# Altium schematic symbol library jlcpcb_2025_04_capacitors_extended_1206.schlib: 2503 symbols (part 9 of 14) (continued)
## CL31C471JBCNNNC
designator C?  Capacitance: 470pF  (hidden comment: *)
Capacitor, Ceramic (MLCC), 470pF, ±5%, 50V, C0G, ±5%, SMD 1206; Manufacturer: Samsung Electro-Mechanics; Manufacturer Part Number: CL31C471JBCNNNC; Package Size: 1206; JLCPCB Basic Part: No; JLCPCB Part Number: C730491; Supplier 1: LCSC; Category: Capacitors - MLCC; Supplier Part Number 1: C730491; Tolerance: ±5%; Voltage Rating: 50V; Temperature Coefficient: C0G; RoHS: Yes; ComponentLink1Description: Datasheet; ComponentLink2Description: JLCPCB Part URL; ComponentLink2URL: https://jlcpcb.com/partdetail/C730491; ComponentLink3Description: LCSC Part URL; ComponentLink3URL: https://lcsc.com/product-detail/Multilayer-Ceramic-Capacitors-MLCC---SMD-SMT_Samsung-Electro-Mechanics-Samsung-Electro-Mechanics-CL31C471JBCNNNC_C730491.html; ComponentLink4Description: Samsung Component Library; ComponentLink4URL: https://weblib.samsungsem.com/mlcc/mlcc-ec.do?partNumber=CL31C471JBCNNN
footprint CAP-1206 (1206 (3216M) Capacitor)
pins: 1, 2

## CL31C820JBCNNNC
designator C?  Capacitance: 82pF  (hidden comment: *)
Capacitor, Ceramic (MLCC), 82pF, ±5%, 50V, C0G, ±5%, SMD 1206; Manufacturer: Samsung Electro-Mechanics; Manufacturer Part Number: CL31C820JBCNNNC; Package Size: 1206; JLCPCB Basic Part: No; JLCPCB Part Number: C377819; Supplier 1: LCSC; Category: Capacitors - MLCC; Supplier Part Number 1: C377819; Tolerance: ±5%; Voltage Rating: 50V; Temperature Coefficient: C0G; RoHS: Yes; ComponentLink1Description: Datasheet; ComponentLink1URL: https://wmsc.lcsc.com/wmsc/upload/file/pdf/v2/lcsc/2304140030_Samsung-Electro-Mechanics-CL31C820JBCNNNC_C377819.pdf; ComponentLink2Description: JLCPCB Part URL; ComponentLink2URL: https://jlcpcb.com/partdetail/C377819; ComponentLink3Description: LCSC Part URL; ComponentLink3URL: https://lcsc.com/product-detail/Multilayer-Ceramic-Capacitors-MLCC---SMD-SMT_Samsung-Electro-Mechanics-Samsung-Electro-Mechanics-CL31C820JBCNNNC_C377819.html; ComponentLink4Description: Samsung Component Library; ComponentLink4URL: https://weblib.samsungsem.com/mlcc/mlcc-ec.do?partNumber=CL31C820JBCNNN
footprint CAP-1206 (1206 (3216M) Capacitor)
pins: 1, 2

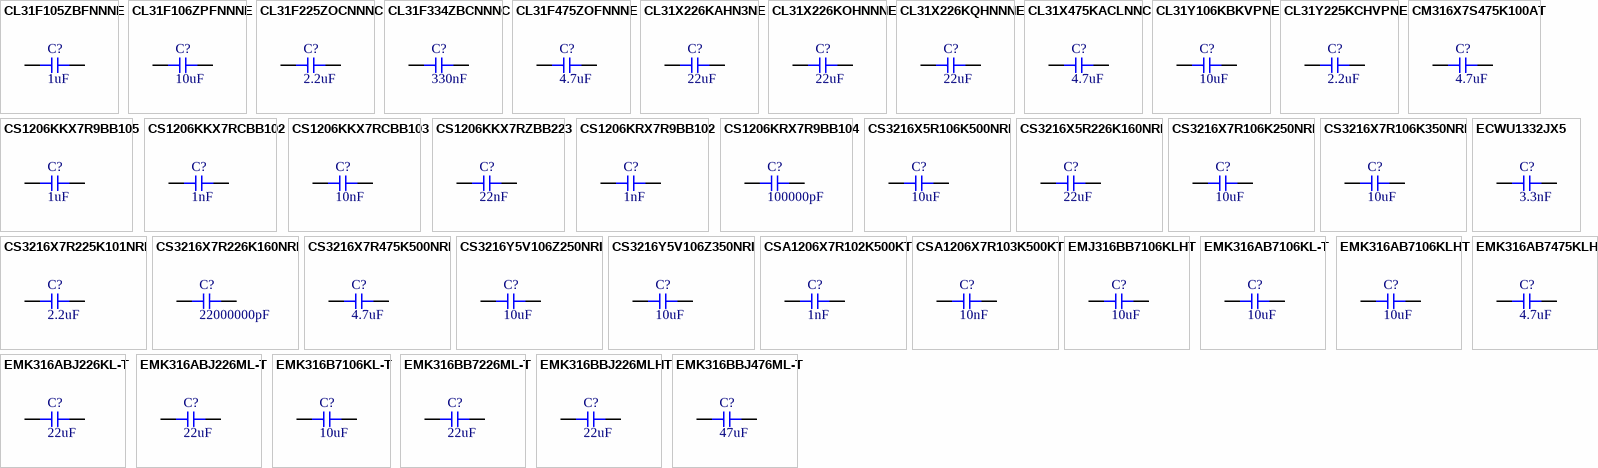
[diagram p39: symbols CL31F105ZBFNNNE to EMK316BBJ476ML-T]

## CL31F105ZBFNNNE
designator C?  Capacitance: 1uF  (hidden comment: *)
Capacitor, Ceramic (MLCC), 1uF, 50V, Y5V, SMD 1206; Manufacturer: Samsung Electro-Mechanics; Manufacturer Part Number: CL31F105ZBFNNNE; Temperature Rating: -20%~+80%; Package Size: 1206; JLCPCB Basic Part: No; JLCPCB Part Number: C307582; Supplier 1: LCSC; Category: Capacitors - MLCC; Supplier Part Number 1: C307582; Voltage Rating: 50V; Temperature Coefficient: Y5V; RoHS: Yes; ComponentLink1Description: Datasheet; ComponentLink1URL: https://wmsc.lcsc.com/wmsc/upload/file/pdf/v2/lcsc/2304140030_Samsung-Electro-Mechanics-CL31F105ZBFNNNE_C307582.pdf; ComponentLink2Description: JLCPCB Part URL; ComponentLink2URL: https://jlcpcb.com/partdetail/C307582; ComponentLink3Description: LCSC Part URL; ComponentLink3URL: https://lcsc.com/product-detail/Multilayer-Ceramic-Capacitors-MLCC---SMD-SMT_Samsung-Electro-Mechanics-Samsung-Electro-Mechanics-CL31F105ZBFNNNE_C307582.html; ComponentLink4Description: Samsung Component Library; ComponentLink4URL: https://weblib.samsungsem.com/mlcc/mlcc-ec.do?partNumber=CL31F105ZBFNNN
footprint CAP-1206 (1206 (3216M) Capacitor)
pins: 1, 2

## CL31F106ZPFNNNE
designator C?  Capacitance: 10uF  (hidden comment: *)
Capacitor, Ceramic (MLCC), 10uF, 10V, Y5V, SMD 1206; Manufacturer: Samsung Electro-Mechanics; Manufacturer Part Number: CL31F106ZPFNNNE; Temperature Rating: -20%~+80%; Package Size: 1206; JLCPCB Basic Part: No; JLCPCB Part Number: C170100; Supplier 1: LCSC; Category: Capacitors - MLCC; Supplier Part Number 1: C170100; Voltage Rating: 10V; Temperature Coefficient: Y5V; RoHS: Yes; ComponentLink1Description: Datasheet; ComponentLink1URL: https://wmsc.lcsc.com/wmsc/upload/file/pdf/v2/lcsc/2304140030_Samsung-Electro-Mechanics-CL31F106ZPFNNNE_C170100.pdf; ComponentLink2Description: JLCPCB Part URL; ComponentLink2URL: https://jlcpcb.com/partdetail/C170100; ComponentLink3Description: LCSC Part URL; ComponentLink3URL: https://lcsc.com/product-detail/Multilayer-Ceramic-Capacitors-MLCC---SMD-SMT_Samsung-Electro-Mechanics-Samsung-Electro-Mechanics-CL31F106ZPFNNNE_C170100.html; ComponentLink4Description: Samsung Component Library; ComponentLink4URL: https://weblib.samsungsem.com/mlcc/mlcc-ec.do?partNumber=CL31F106ZPFNNN
footprint CAP-1206 (1206 (3216M) Capacitor)
pins: 1, 2

## CL31F225ZOCNNNC
designator C?  Capacitance: 2.2uF  (hidden comment: *)
Capacitor, Ceramic (MLCC), 2.2uF, 16V, Y5V, SMD 1206; Manufacturer: Samsung Electro-Mechanics; Manufacturer Part Number: CL31F225ZOCNNNC; Temperature Rating: -20%~+80%; Package Size: 1206; JLCPCB Basic Part: No; JLCPCB Part Number: C307583; Supplier 1: LCSC; Category: Capacitors - MLCC; Supplier Part Number 1: C307583; Voltage Rating: 16V; Temperature Coefficient: Y5V; RoHS: Yes; ComponentLink1Description: Datasheet; ComponentLink1URL: https://wmsc.lcsc.com/wmsc/upload/file/pdf/v2/lcsc/2304140030_Samsung-Electro-Mechanics-CL31F225ZOCNNNC_C307583.pdf; ComponentLink2Description: JLCPCB Part URL; ComponentLink2URL: https://jlcpcb.com/partdetail/C307583; ComponentLink3Description: LCSC Part URL; ComponentLink3URL: https://lcsc.com/product-detail/Multilayer-Ceramic-Capacitors-MLCC---SMD-SMT_Samsung-Electro-Mechanics-Samsung-Electro-Mechanics-CL31F225ZOCNNNC_C307583.html; ComponentLink4Description: Samsung Component Library; ComponentLink4URL: https://weblib.samsungsem.com/mlcc/mlcc-ec.do?partNumber=CL31F225ZOCNNN
footprint CAP-1206 (1206 (3216M) Capacitor)
pins: 1, 2

## CL31F334ZBCNNNC
designator C?  Capacitance: 330nF  (hidden comment: *)
Capacitor, Ceramic (MLCC), 330nF, 50V, Y5V, SMD 1206; Manufacturer: Samsung Electro-Mechanics; Manufacturer Part Number: CL31F334ZBCNNNC; Temperature Rating: -20%~+80%; Package Size: 1206; JLCPCB Basic Part: No; JLCPCB Part Number: C377820; Supplier 1: LCSC; Category: Capacitors - MLCC; Supplier Part Number 1: C377820; Voltage Rating: 50V; Temperature Coefficient: Y5V; RoHS: Yes; ComponentLink1Description: Datasheet; ComponentLink1URL: https://wmsc.lcsc.com/wmsc/upload/file/pdf/v2/lcsc/2304140030_Samsung-Electro-Mechanics-CL31F334ZBCNNNC_C377820.pdf; ComponentLink2Description: JLCPCB Part URL; ComponentLink2URL: https://jlcpcb.com/partdetail/C377820; ComponentLink3Description: LCSC Part URL; ComponentLink3URL: https://lcsc.com/product-detail/Multilayer-Ceramic-Capacitors-MLCC---SMD-SMT_Samsung-Electro-Mechanics-Samsung-Electro-Mechanics-CL31F334ZBCNNNC_C377820.html; ComponentLink4Description: Samsung Component Library; ComponentLink4URL: https://weblib.samsungsem.com/mlcc/mlcc-ec.do?partNumber=CL31F334ZBCNNN
footprint CAP-1206 (1206 (3216M) Capacitor)
pins: 1, 2

## CL31F475ZOFNNNE
designator C?  Capacitance: 4.7uF  (hidden comment: *)
Capacitor, Ceramic (MLCC), 4.7uF, 16V, Y5V, SMD 1206; Manufacturer: Samsung Electro-Mechanics; Manufacturer Part Number: CL31F475ZOFNNNE; Temperature Rating: -20%~+80%; Package Size: 1206; JLCPCB Basic Part: No; JLCPCB Part Number: C159748; Supplier 1: LCSC; Category: Capacitors - MLCC; Supplier Part Number 1: C159748; Voltage Rating: 16V; Temperature Coefficient: Y5V; RoHS: Yes; ComponentLink1Description: Datasheet; ComponentLink1URL: https://wmsc.lcsc.com/wmsc/upload/file/pdf/v2/lcsc/2304140030_Samsung-Electro-Mechanics-CL31F475ZOFNNNE_C159748.pdf; ComponentLink2Description: JLCPCB Part URL; ComponentLink2URL: https://jlcpcb.com/partdetail/C159748; ComponentLink3Description: LCSC Part URL; ComponentLink3URL: https://lcsc.com/product-detail/Multilayer-Ceramic-Capacitors-MLCC---SMD-SMT_Samsung-Electro-Mechanics-Samsung-Electro-Mechanics-CL31F475ZOFNNNE_C159748.html; ComponentLink4Description: Samsung Component Library; ComponentLink4URL: https://weblib.samsungsem.com/mlcc/mlcc-ec.do?partNumber=CL31F475ZOFNNN
footprint CAP-1206 (1206 (3216M) Capacitor)
pins: 1, 2

## CL31X226KAHN3NE
designator C?  Capacitance: 22uF  (hidden comment: *)
Capacitor, Ceramic (MLCC), 22uF, ±10%, 25V, X6S, ±10%, SMD 1206; Manufacturer: Samsung Electro-Mechanics; Manufacturer Part Number: CL31X226KAHN3NE; Package Size: 1206; JLCPCB Basic Part: No; JLCPCB Part Number: C478862; Supplier 1: LCSC; Category: Capacitors - MLCC; Supplier Part Number 1: C478862; Tolerance: ±10%; Voltage Rating: 25V; Temperature Coefficient: X6S; RoHS: Yes; ComponentLink1Description: Datasheet; ComponentLink1URL: https://wmsc.lcsc.com/wmsc/upload/file/pdf/v2/lcsc/2304140030_Samsung-Electro-Mechanics-CL31X226KAHN3NE_C478862.pdf; ComponentLink2Description: JLCPCB Part URL; ComponentLink2URL: https://jlcpcb.com/partdetail/C478862; ComponentLink3Description: LCSC Part URL; ComponentLink3URL: https://lcsc.com/product-detail/Multilayer-Ceramic-Capacitors-MLCC---SMD-SMT_Samsung-Electro-Mechanics-Samsung-Electro-Mechanics-CL31X226KAHN3NE_C478862.html; ComponentLink4Description: Samsung Component Library; ComponentLink4URL: https://weblib.samsungsem.com/mlcc/mlcc-ec.do?partNumber=CL31X226KAHN3N
footprint CAP-1206 (1206 (3216M) Capacitor)
pins: 1, 2

## CL31X226KOHNNNE
designator C?  Capacitance: 22uF  (hidden comment: *)
Capacitor, Ceramic (MLCC), 22uF, ±10%, 16V, X6S, ±10%, SMD 1206; Manufacturer: Samsung Electro-Mechanics; Manufacturer Part Number: CL31X226KOHNNNE; Package Size: 1206; JLCPCB Basic Part: No; JLCPCB Part Number: C2991797; Supplier 1: LCSC; Category: Capacitors - MLCC; Supplier Part Number 1: C2991797; Tolerance: ±10%; Voltage Rating: 16V; Temperature Coefficient: X6S; RoHS: Yes; ComponentLink1Description: Datasheet; ComponentLink1URL: https://wmsc.lcsc.com/wmsc/upload/file/pdf/v2/lcsc/2204111630_Samsung-Electro-Mechanics-CL31X226KOHNNNE_C2991797.pdf; ComponentLink2Description: JLCPCB Part URL; ComponentLink2URL: https://jlcpcb.com/partdetail/C2991797; ComponentLink3Description: LCSC Part URL; ComponentLink3URL: https://lcsc.com/product-detail/Multilayer-Ceramic-Capacitors-MLCC---SMD-SMT_Samsung-Electro-Mechanics-Samsung-Electro-Mechanics-CL31X226KOHNNNE_C2991797.html; ComponentLink4Description: Samsung Component Library; ComponentLink4URL: https://weblib.samsungsem.com/mlcc/mlcc-ec.do?partNumber=CL31X226KOHNNN
footprint CAP-1206 (1206 (3216M) Capacitor)
pins: 1, 2

## CL31X226KQHNNNE
designator C?  Capacitance: 22uF  (hidden comment: *)
Capacitor, Ceramic (MLCC), 22uF, ±10%, 6.3V, X6S, ±10%, SMD 1206; Manufacturer: Samsung Electro-Mechanics; Manufacturer Part Number: CL31X226KQHNNNE; Package Size: 1206; JLCPCB Basic Part: No; JLCPCB Part Number: C444887; Supplier 1: LCSC; Category: Capacitors - MLCC; Supplier Part Number 1: C444887; Tolerance: ±10%; Voltage Rating: 6.3V; Temperature Coefficient: X6S; RoHS: Yes; ComponentLink1Description: Datasheet; ComponentLink1URL: https://wmsc.lcsc.com/wmsc/upload/file/pdf/v2/lcsc/2004091405_Samsung-Electro-Mechanics-CL31X226KQHNNNE_C444887.pdf; ComponentLink2Description: JLCPCB Part URL; ComponentLink2URL: https://jlcpcb.com/partdetail/C444887; ComponentLink3Description: LCSC Part URL; ComponentLink3URL: https://lcsc.com/product-detail/Multilayer-Ceramic-Capacitors-MLCC---SMD-SMT_Samsung-Electro-Mechanics-Samsung-Electro-Mechanics-CL31X226KQHNNNE_C444887.html; ComponentLink4Description: Samsung Component Library; ComponentLink4URL: https://weblib.samsungsem.com/mlcc/mlcc-ec.do?partNumber=CL31X226KQHNNN
footprint CAP-1206 (1206 (3216M) Capacitor)
pins: 1, 2

## CL31X475KACLNNC
designator C?  Capacitance: 4.7uF  (hidden comment: *)
Capacitor, Ceramic (MLCC), 4.7uF, ±10%, 25V, X6S, ±10%, SMD 1206; Manufacturer: Samsung Electro-Mechanics; Manufacturer Part Number: CL31X475KACLNNC; Package Size: 1206; JLCPCB Basic Part: No; JLCPCB Part Number: C377822; Supplier 1: LCSC; Category: Capacitors - MLCC; Supplier Part Number 1: C377822; Tolerance: ±10%; Voltage Rating: 25V; Temperature Coefficient: X6S; RoHS: Yes; ComponentLink1Description: Datasheet; ComponentLink1URL: https://wmsc.lcsc.com/wmsc/upload/file/pdf/v2/lcsc/2304140030_Samsung-Electro-Mechanics-CL31X475KACLNNC_C377822.pdf; ComponentLink2Description: JLCPCB Part URL; ComponentLink2URL: https://jlcpcb.com/partdetail/C377822; ComponentLink3Description: LCSC Part URL; ComponentLink3URL: https://lcsc.com/product-detail/Multilayer-Ceramic-Capacitors-MLCC---SMD-SMT_Samsung-Electro-Mechanics-Samsung-Electro-Mechanics-CL31X475KACLNNC_C377822.html; ComponentLink4Description: Samsung Component Library; ComponentLink4URL: https://weblib.samsungsem.com/mlcc/mlcc-ec.do?partNumber=CL31X475KACLNN
footprint CAP-1206 (1206 (3216M) Capacitor)
pins: 1, 2

## CL31Y106KBKVPNE
designator C?  Capacitance: 10uF  (hidden comment: *)
Capacitor, Ceramic (MLCC), 10uF, ±10%, 50V, ±10%, SMD 1206; Manufacturer: Samsung Electro-Mechanics; Manufacturer Part Number: CL31Y106KBKVPNE; Package Size: 1206; JLCPCB Basic Part: No; JLCPCB Part Number: C2803389; Supplier 1: LCSC; Category: Capacitors - MLCC; Supplier Part Number 1: C2803389; Tolerance: ±10%; Voltage Rating: 50V; RoHS: Yes; ComponentLink1Description: Datasheet; ComponentLink1URL: https://wmsc.lcsc.com/wmsc/upload/file/pdf/v2/lcsc/2304140030_Samsung-Electro-Mechanics-CL31Y106KBKVPNE_C2803389.pdf; ComponentLink2Description: JLCPCB Part URL; ComponentLink2URL: https://jlcpcb.com/partdetail/C2803389; ComponentLink3Description: LCSC Part URL; ComponentLink3URL: https://lcsc.com/product-detail/Multilayer-Ceramic-Capacitors-MLCC---SMD-SMT_Samsung-Electro-Mechanics-Samsung-Electro-Mechanics-CL31Y106KBKVPNE_C2803389.html; ComponentLink4Description: Samsung Component Library; ComponentLink4URL: https://weblib.samsungsem.com/mlcc/mlcc-ec.do?partNumber=CL31Y106KBKVPN
footprint CAP-1206 (1206 (3216M) Capacitor)
pins: 1, 2

## CL31Y225KCHVPNE
designator C?  Capacitance: 2.2uF  (hidden comment: *)
Capacitor, Ceramic (MLCC), 2.2uF, ±10%, 100V, X7S, ±10%, SMD 1206; Manufacturer: Samsung Electro-Mechanics; Manufacturer Part Number: CL31Y225KCHVPNE; Package Size: 1206; JLCPCB Basic Part: No; JLCPCB Part Number: C2803390; Supplier 1: LCSC; Category: Capacitors - MLCC; Supplier Part Number 1: C2803390; Tolerance: ±10%; Voltage Rating: 100V; Temperature Coefficient: X7S; RoHS: Yes; ComponentLink1Description: Datasheet; ComponentLink1URL: https://wmsc.lcsc.com/wmsc/upload/file/pdf/v2/lcsc/2304140030_Samsung-Electro-Mechanics-CL31Y225KCHVPNE_C2803390.pdf; ComponentLink2Description: JLCPCB Part URL; ComponentLink2URL: https://jlcpcb.com/partdetail/C2803390; ComponentLink3Description: LCSC Part URL; ComponentLink3URL: https://lcsc.com/product-detail/Multilayer-Ceramic-Capacitors-MLCC---SMD-SMT_Samsung-Electro-Mechanics-Samsung-Electro-Mechanics-CL31Y225KCHVPNE_C2803390.html; ComponentLink4Description: Samsung Component Library; ComponentLink4URL: https://weblib.samsungsem.com/mlcc/mlcc-ec.do?partNumber=CL31Y225KCHVPN
footprint CAP-1206 (1206 (3216M) Capacitor)
pins: 1, 2

## CM316X7S475K100AT
designator C?  Capacitance: 4.7uF  (hidden comment: *)
Capacitor, Ceramic (MLCC), 4.7uF, ±10%, 100V, X7S, ±10%, SMD 1206; Manufacturer: Kyocera; Manufacturer Part Number: CM316X7S475K100AT; Package Size: 1206; JLCPCB Basic Part: No; JLCPCB Part Number: C2900750; Supplier 1: LCSC; Category: Capacitors - MLCC; Supplier Part Number 1: C2900750; Tolerance: ±10%; Voltage Rating: 100V; Temperature Coefficient: X7S; RoHS: Yes; ComponentLink1Description: Datasheet; ComponentLink1URL: https://wmsc.lcsc.com/wmsc/upload/file/pdf/v2/lcsc/2110121030_Kyocera-AVX-CM316X7S475K100AT_C2900750.pdf; ComponentLink2Description: JLCPCB Part URL; ComponentLink2URL: https://jlcpcb.com/partdetail/C2900750; ComponentLink3Description: LCSC Part URL; ComponentLink3URL: https://lcsc.com/product-detail/Multilayer-Ceramic-Capacitors-MLCC---SMD-SMT_Kyocera-AVX-Kyocera-AVX-CM316X7S475K100AT_C2900750.html
footprint CAP-1206 (1206 (3216M) Capacitor)
pins: 1, 2

## CS1206KKX7R9BB105
designator C?  Capacitance: 1uF  (hidden comment: *)
Capacitor, Ceramic (MLCC), 1uF, ±10%, 50V, X7R, ±10%, SMD 1206; Manufacturer: YAGEO; Manufacturer Part Number: CS1206KKX7R9BB105; Package Size: 1206; JLCPCB Basic Part: No; JLCPCB Part Number: C577433; Supplier 1: LCSC; Category: Capacitors - MLCC; Supplier Part Number 1: C577433; Tolerance: ±10%; Voltage Rating: 50V; Temperature Coefficient: X7R; RoHS: Yes; ComponentLink1Description: Datasheet; ComponentLink1URL: https://wmsc.lcsc.com/wmsc/upload/file/pdf/v2/lcsc/2304140030_YAGEO-CS1206KKX7R9BB105_C577433.pdf; ComponentLink2Description: JLCPCB Part URL; ComponentLink2URL: https://jlcpcb.com/partdetail/C577433; ComponentLink3Description: LCSC Part URL; ComponentLink3URL: https://lcsc.com/product-detail/Multilayer-Ceramic-Capacitors-MLCC---SMD-SMT_YAGEO-YAGEO-CS1206KKX7R9BB105_C577433.html
footprint CAP-1206 (1206 (3216M) Capacitor)
pins: 1, 2

## CS1206KKX7RCBB102
designator C?  Capacitance: 1nF  (hidden comment: *)
Capacitor, Ceramic (MLCC), 1nF, ±10%, X7R, ±10%, SMD 1206; Manufacturer: YAGEO; Manufacturer Part Number: CS1206KKX7RCBB102; Package Size: 1206; JLCPCB Basic Part: No; JLCPCB Part Number: C577435; Supplier 1: LCSC; Category: Capacitors - MLCC; Supplier Part Number 1: C577435; Tolerance: ±10%; Temperature Coefficient: X7R; RoHS: Yes; ComponentLink1Description: Datasheet; ComponentLink1URL: https://wmsc.lcsc.com/wmsc/upload/file/pdf/v2/lcsc/2208251800_YAGEO-CS1206KKX7RCBB102_C577435.pdf; ComponentLink2Description: JLCPCB Part URL; ComponentLink2URL: https://jlcpcb.com/partdetail/C577435; ComponentLink3Description: LCSC Part URL; ComponentLink3URL: https://lcsc.com/product-detail/Multilayer-Ceramic-Capacitors-MLCC---SMD-SMT_YAGEO-YAGEO-CS1206KKX7RCBB102_C577435.html
footprint CAP-1206 (1206 (3216M) Capacitor)
pins: 1, 2

## CS1206KKX7RCBB103
designator C?  Capacitance: 10nF  (hidden comment: *)
Capacitor, Ceramic (MLCC), 10nF, ±10%, 1kV, X7R, ±10%, SMD 1206; Manufacturer: YAGEO; Manufacturer Part Number: CS1206KKX7RCBB103; Package Size: 1206; JLCPCB Basic Part: No; JLCPCB Part Number: C577436; Supplier 1: LCSC; Category: Capacitors - MLCC; Supplier Part Number 1: C577436; Tolerance: ±10%; Voltage Rating: 1kV; Temperature Coefficient: X7R; RoHS: Yes; ComponentLink1Description: Datasheet; ComponentLink1URL: https://wmsc.lcsc.com/wmsc/upload/file/pdf/v2/lcsc/2304140030_YAGEO-CS1206KKX7RCBB103_C577436.pdf; ComponentLink2Description: JLCPCB Part URL; ComponentLink2URL: https://jlcpcb.com/partdetail/C577436; ComponentLink3Description: LCSC Part URL; ComponentLink3URL: https://lcsc.com/product-detail/Multilayer-Ceramic-Capacitors-MLCC---SMD-SMT_YAGEO-YAGEO-CS1206KKX7RCBB103_C577436.html
footprint CAP-1206 (1206 (3216M) Capacitor)
pins: 1, 2

## CS1206KKX7RZBB223
designator C?  Capacitance: 22nF  (hidden comment: *)
Capacitor, Ceramic (MLCC), 22nF, ±10%, 630V, X7R, ±10%, SMD 1206; Manufacturer: YAGEO; Manufacturer Part Number: CS1206KKX7RZBB223; Package Size: 1206; JLCPCB Basic Part: No; JLCPCB Part Number: C577440; Supplier 1: LCSC; Category: Capacitors - MLCC; Supplier Part Number 1: C577440; Tolerance: ±10%; Voltage Rating: 630V; Temperature Coefficient: X7R; RoHS: Yes; ComponentLink1Description: Datasheet; ComponentLink1URL: https://wmsc.lcsc.com/wmsc/upload/file/pdf/v2/lcsc/2112151030_YAGEO-CS1206KKX7RZBB223_C577440.pdf; ComponentLink2Description: JLCPCB Part URL; ComponentLink2URL: https://jlcpcb.com/partdetail/C577440; ComponentLink3Description: LCSC Part URL; ComponentLink3URL: https://lcsc.com/product-detail/Multilayer-Ceramic-Capacitors-MLCC---SMD-SMT_YAGEO-YAGEO-CS1206KKX7RZBB223_C577440.html
footprint CAP-1206 (1206 (3216M) Capacitor)
pins: 1, 2

## CS1206KRX7R9BB102
designator C?  Capacitance: 1nF  (hidden comment: *)
Capacitor, Ceramic (MLCC), 1nF, ±10%, 50V, X7R, ±10%, SMD 1206; Manufacturer: YAGEO; Manufacturer Part Number: CS1206KRX7R9BB102; Package Size: 1206; JLCPCB Basic Part: No; JLCPCB Part Number: C2173292; Supplier 1: LCSC; Category: Capacitors - MLCC; Supplier Part Number 1: C2173292; Tolerance: ±10%; Voltage Rating: 50V; Temperature Coefficient: X7R; RoHS: Yes; ComponentLink1Description: Datasheet; ComponentLink1URL: https://wmsc.lcsc.com/wmsc/upload/file/pdf/v2/lcsc/2202040630_YAGEO-CS1206KRX7R9BB102_C2173292.pdf; ComponentLink2Description: JLCPCB Part URL; ComponentLink2URL: https://jlcpcb.com/partdetail/C2173292; ComponentLink3Description: LCSC Part URL; ComponentLink3URL: https://lcsc.com/product-detail/Multilayer-Ceramic-Capacitors-MLCC---SMD-SMT_YAGEO-YAGEO-CS1206KRX7R9BB102_C2173292.html
footprint CAP-1206 (1206 (3216M) Capacitor)
pins: 1, 2

## CS1206KRX7R9BB104
designator C?  Capacitance: 100000pF  (hidden comment: *)
Capacitor, Ceramic (MLCC), 100000pF, ±10%, null, X7R, ±10%, SMD 1206; Manufacturer: YAGEO; Manufacturer Part Number: CS1206KRX7R9BB104; Package Size: 1206; JLCPCB Basic Part: No; JLCPCB Part Number: C577441; Supplier 1: LCSC; Category: Capacitors - MLCC; Supplier Part Number 1: C577441; Tolerance: ±10%; Voltage Rating: null; Temperature Coefficient: X7R; RoHS: Yes; ComponentLink1Description: Datasheet; ComponentLink1URL: https://wmsc.lcsc.com/wmsc/upload/file/pdf/v2/lcsc/2211211800_YAGEO-CS1206KRX7R9BB104_C577441.pdf; ComponentLink2Description: JLCPCB Part URL; ComponentLink2URL: https://jlcpcb.com/partdetail/C577441; ComponentLink3Description: LCSC Part URL; ComponentLink3URL: https://lcsc.com/product-detail/Multilayer-Ceramic-Capacitors-MLCC---SMD-SMT_YAGEO-YAGEO-CS1206KRX7R9BB104_C577441.html
footprint CAP-1206 (1206 (3216M) Capacitor)
pins: 1, 2

## CS3216X5R106K500NRI
designator C?  Capacitance: 10uF  (hidden comment: *)
Capacitor, Ceramic (MLCC), 10uF, ±10%, 50V, X5R, ±10%, SMD 1206; Manufacturer: Samwha Capacitor; Manufacturer Part Number: CS3216X5R106K500NRI; Package Size: 1206; JLCPCB Basic Part: No; JLCPCB Part Number: C513774; Supplier 1: LCSC; Category: Capacitors - MLCC; Supplier Part Number 1: C513774; Tolerance: ±10%; Voltage Rating: 50V; Temperature Coefficient: X5R; RoHS: Yes; ComponentLink1Description: Datasheet; ComponentLink1URL: https://wmsc.lcsc.com/wmsc/upload/file/pdf/v2/lcsc/2005191033_Samwha-Capacitor-CS3216X5R106K500NRI_C513774.pdf; ComponentLink2Description: JLCPCB Part URL; ComponentLink2URL: https://jlcpcb.com/partdetail/C513774; ComponentLink3Description: LCSC Part URL; ComponentLink3URL: https://lcsc.com/product-detail/Multilayer-Ceramic-Capacitors-MLCC---SMD-SMT_Samwha-Capacitor-Samwha-Capacitor-CS3216X5R106K500NRI_C513774.html
footprint CAP-1206 (1206 (3216M) Capacitor)
pins: 1, 2

## CS3216X5R226K160NRI
designator C?  Capacitance: 22uF  (hidden comment: *)
Capacitor, Ceramic (MLCC), 22uF, ±10%, 16V, X5R, ±10%, SMD 1206; Manufacturer: Samwha Capacitor; Manufacturer Part Number: CS3216X5R226K160NRI; Package Size: 1206; JLCPCB Basic Part: No; JLCPCB Part Number: C513771; Supplier 1: LCSC; Category: Capacitors - MLCC; Supplier Part Number 1: C513771; Tolerance: ±10%; Voltage Rating: 16V; Temperature Coefficient: X5R; RoHS: Yes; ComponentLink1Description: Datasheet; ComponentLink1URL: https://wmsc.lcsc.com/wmsc/upload/file/pdf/v2/lcsc/2005291832_Samwha-Capacitor-CS3216X5R226K160NRI_C513771.pdf; ComponentLink2Description: JLCPCB Part URL; ComponentLink2URL: https://jlcpcb.com/partdetail/C513771; ComponentLink3Description: LCSC Part URL; ComponentLink3URL: https://lcsc.com/product-detail/Multilayer-Ceramic-Capacitors-MLCC---SMD-SMT_Samwha-Capacitor-Samwha-Capacitor-CS3216X5R226K160NRI_C513771.html
footprint CAP-1206 (1206 (3216M) Capacitor)
pins: 1, 2

## CS3216X7R106K250NRI
designator C?  Capacitance: 10uF  (hidden comment: *)
Capacitor, Ceramic (MLCC), 10uF, ±10%, 25V, X7R, ±10%, SMD 1206; Manufacturer: Samwha Capacitor; Manufacturer Part Number: CS3216X7R106K250NRI; Package Size: 1206; JLCPCB Basic Part: No; JLCPCB Part Number: C513767; Supplier 1: LCSC; Category: Capacitors - MLCC; Supplier Part Number 1: C513767; Tolerance: ±10%; Voltage Rating: 25V; Temperature Coefficient: X7R; RoHS: Yes; ComponentLink1Description: Datasheet; ComponentLink1URL: https://wmsc.lcsc.com/wmsc/upload/file/pdf/v2/lcsc/2007271833_Samwha-Capacitor-CS3216X7R106K250NRI_C513767.pdf; ComponentLink2Description: JLCPCB Part URL; ComponentLink2URL: https://jlcpcb.com/partdetail/C513767; ComponentLink3Description: LCSC Part URL; ComponentLink3URL: https://lcsc.com/product-detail/Multilayer-Ceramic-Capacitors-MLCC---SMD-SMT_Samwha-Capacitor-Samwha-Capacitor-CS3216X7R106K250NRI_C513767.html
footprint CAP-1206 (1206 (3216M) Capacitor)
pins: 1, 2

## CS3216X7R106K350NRI
designator C?  Capacitance: 10uF  (hidden comment: *)
Capacitor, Ceramic (MLCC), 10uF, ±10%, 35V, ±10%, SMD 1206; Manufacturer: Samwha Capacitor; Manufacturer Part Number: CS3216X7R106K350NRI; Package Size: 1206; JLCPCB Basic Part: No; JLCPCB Part Number: C920965; Supplier 1: LCSC; Category: Capacitors - MLCC; Supplier Part Number 1: C920965; Tolerance: ±10%; Voltage Rating: 35V; RoHS: Yes; ComponentLink1Description: Datasheet; ComponentLink2Description: JLCPCB Part URL; ComponentLink2URL: https://jlcpcb.com/partdetail/C920965; ComponentLink3Description: LCSC Part URL; ComponentLink3URL: https://lcsc.com/product-detail/Multilayer-Ceramic-Capacitors-MLCC---SMD-SMT_Samwha-Capacitor-Samwha-Capacitor-CS3216X7R106K350NRI_C920965.html
footprint CAP-1206 (1206 (3216M) Capacitor)
pins: 1, 2

## CS3216X7R225K101NRI
designator C?  Capacitance: 2.2uF  (hidden comment: *)
Capacitor, Ceramic (MLCC), 2.2uF, ±10%, 100V, ±10%, SMD 1206; Manufacturer: Samwha Capacitor; Manufacturer Part Number: CS3216X7R225K101NRI; Package Size: 1206; JLCPCB Basic Part: No; JLCPCB Part Number: C920964; Supplier 1: LCSC; Category: Capacitors - MLCC; Supplier Part Number 1: C920964; Tolerance: ±10%; Voltage Rating: 100V; RoHS: Yes; ComponentLink1Description: Datasheet; ComponentLink1URL: https://wmsc.lcsc.com/wmsc/upload/file/pdf/v2/lcsc/2203281730_Samwha-Capacitor-CS3216X7R225K101NRI_C920964.pdf; ComponentLink2Description: JLCPCB Part URL; ComponentLink2URL: https://jlcpcb.com/partdetail/C920964; ComponentLink3Description: LCSC Part URL; ComponentLink3URL: https://lcsc.com/product-detail/Multilayer-Ceramic-Capacitors-MLCC---SMD-SMT_Samwha-Capacitor-Samwha-Capacitor-CS3216X7R225K101NRI_C920964.html
footprint CAP-1206 (1206 (3216M) Capacitor)
pins: 1, 2

## CS3216X7R226K160NRI
designator C?  Capacitance: 22000000pF  (hidden comment: *)
Capacitor, Ceramic (MLCC), 22000000pF, ±10%, 16V, X7R, ±10%, SMD 1206; Manufacturer: Samwha Capacitor; Manufacturer Part Number: CS3216X7R226K160NRI; Package Size: 1206; JLCPCB Basic Part: No; JLCPCB Part Number: C5252682; Supplier 1: LCSC; Category: Capacitors - MLCC; Supplier Part Number 1: C5252682; Tolerance: ±10%; Voltage Rating: 16V; Temperature Coefficient: X7R; RoHS: Yes; ComponentLink1Description: Datasheet; ComponentLink1URL: https://wmsc.lcsc.com/wmsc/upload/file/pdf/v2/lcsc/2211101800_Samwha-Capacitor-CS3216X7R226K160NRI_C5252682.pdf; ComponentLink2Description: JLCPCB Part URL; ComponentLink2URL: https://jlcpcb.com/partdetail/C5252682; ComponentLink3Description: LCSC Part URL; ComponentLink3URL: https://lcsc.com/product-detail/Multilayer-Ceramic-Capacitors-MLCC---SMD-SMT_Samwha-Capacitor-Samwha-Capacitor-CS3216X7R226K160NRI_C5252682.html
footprint CAP-1206 (1206 (3216M) Capacitor)
pins: 1, 2

## CS3216X7R475K500NRI
designator C?  Capacitance: 4.7uF  (hidden comment: *)
Capacitor, Ceramic (MLCC), 4.7uF, ±10%, 50V, X7R, ±10%, SMD 1206; Manufacturer: Samwha Capacitor; Manufacturer Part Number: CS3216X7R475K500NRI; Package Size: 1206; JLCPCB Basic Part: No; JLCPCB Part Number: C513768; Supplier 1: LCSC; Category: Capacitors - MLCC; Supplier Part Number 1: C513768; Tolerance: ±10%; Voltage Rating: 50V; Temperature Coefficient: X7R; RoHS: Yes; ComponentLink1Description: Datasheet; ComponentLink1URL: https://wmsc.lcsc.com/wmsc/upload/file/pdf/v2/lcsc/2304140030_Samwha-Capacitor-CS3216X7R475K500NRI_C513768.pdf; ComponentLink2Description: JLCPCB Part URL; ComponentLink2URL: https://jlcpcb.com/partdetail/C513768; ComponentLink3Description: LCSC Part URL; ComponentLink3URL: https://lcsc.com/product-detail/Multilayer-Ceramic-Capacitors-MLCC---SMD-SMT_Samwha-Capacitor-Samwha-Capacitor-CS3216X7R475K500NRI_C513768.html
footprint CAP-1206 (1206 (3216M) Capacitor)
pins: 1, 2

## CS3216Y5V106Z250NRI
designator C?  Capacitance: 10uF  (hidden comment: *)
Capacitor, Ceramic (MLCC), 10uF, 25V, Y5V, SMD 1206; Manufacturer: Samwha Capacitor; Manufacturer Part Number: CS3216Y5V106Z250NRI; Package Size: 1206; JLCPCB Basic Part: No; JLCPCB Part Number: C2985037; Supplier 1: LCSC; Category: Capacitors - MLCC; Supplier Part Number 1: C2985037; Voltage Rating: 25V; Temperature Coefficient: Y5V; RoHS: Yes; ComponentLink1Description: Datasheet; ComponentLink1URL: https://wmsc.lcsc.com/wmsc/upload/file/pdf/v2/lcsc/2206061700_Samwha-Capacitor-CS3216Y5V106Z250NRI_C2985037.pdf; ComponentLink2Description: JLCPCB Part URL; ComponentLink2URL: https://jlcpcb.com/partdetail/C2985037; ComponentLink3Description: LCSC Part URL; ComponentLink3URL: https://lcsc.com/product-detail/Multilayer-Ceramic-Capacitors-MLCC---SMD-SMT_Samwha-Capacitor-Samwha-Capacitor-CS3216Y5V106Z250NRI_C2985037.html
footprint CAP-1206 (1206 (3216M) Capacitor)
pins: 1, 2

## CS3216Y5V106Z350NRI
designator C?  Capacitance: 10uF  (hidden comment: *)
Capacitor, Ceramic (MLCC), 10uF, 35V, Y5V, SMD 1206; Manufacturer: Samwha Capacitor; Manufacturer Part Number: CS3216Y5V106Z350NRI; Temperature Rating: -20%~+80%; Package Size: 1206; JLCPCB Basic Part: No; JLCPCB Part Number: C2918487; Supplier 1: LCSC; Category: Capacitors - MLCC; Supplier Part Number 1: C2918487; Voltage Rating: 35V; Temperature Coefficient: Y5V; RoHS: Yes; ComponentLink1Description: Datasheet; ComponentLink1URL: https://wmsc.lcsc.com/wmsc/upload/file/pdf/v2/lcsc/2111172030_Samwha-Capacitor-CS3216Y5V106Z350NRI_C2918487.pdf; ComponentLink2Description: JLCPCB Part URL; ComponentLink2URL: https://jlcpcb.com/partdetail/C2918487; ComponentLink3Description: LCSC Part URL; ComponentLink3URL: https://lcsc.com/product-detail/Multilayer-Ceramic-Capacitors-MLCC---SMD-SMT_Samwha-Capacitor-Samwha-Capacitor-CS3216Y5V106Z350NRI_C2918487.html
footprint CAP-1206 (1206 (3216M) Capacitor)
pins: 1, 2

## CSA1206X7R102K500KT
designator C?  Capacitance: 1nF  (hidden comment: *)
Capacitor, Ceramic (MLCC), 1nF, ±10%, 50V, X7R, ±10%, SMD 1206; Manufacturer: HRE; Manufacturer Part Number: CSA1206X7R102K500KT; Package Size: 1206; JLCPCB Basic Part: No; JLCPCB Part Number: C3015149; Supplier 1: LCSC; Category: Capacitors - MLCC; Supplier Part Number 1: C3015149; Tolerance: ±10%; Voltage Rating: 50V; Temperature Coefficient: X7R; RoHS: Yes; ComponentLink1Description: Datasheet; ComponentLink1URL: https://wmsc.lcsc.com/wmsc/upload/file/pdf/v2/lcsc/2208051100_HRE-CSA1206X7R102K500KT_C3015149.pdf; ComponentLink2Description: JLCPCB Part URL; ComponentLink2URL: https://jlcpcb.com/partdetail/C3015149; ComponentLink3Description: LCSC Part URL; ComponentLink3URL: https://lcsc.com/product-detail/Multilayer-Ceramic-Capacitors-MLCC---SMD-SMT_HRE-HRE-CSA1206X7R102K500KT_C3015149.html
footprint CAP-1206 (1206 (3216M) Capacitor)
pins: 1, 2

## CSA1206X7R103K500KT
designator C?  Capacitance: 10nF  (hidden comment: *)
Capacitor, Ceramic (MLCC), 10nF, ±10%, 50V, X7R, ±10%, SMD 1206; Manufacturer: HRE; Manufacturer Part Number: CSA1206X7R103K500KT; Package Size: 1206; JLCPCB Basic Part: No; JLCPCB Part Number: C3015150; Supplier 1: LCSC; Category: Capacitors - MLCC; Supplier Part Number 1: C3015150; Tolerance: ±10%; Voltage Rating: 50V; Temperature Coefficient: X7R; RoHS: Yes; ComponentLink1Description: Datasheet; ComponentLink1URL: https://wmsc.lcsc.com/wmsc/upload/file/pdf/v2/lcsc/2208051100_HRE-CSA1206X7R103K500KT_C3015150.pdf; ComponentLink2Description: JLCPCB Part URL; ComponentLink2URL: https://jlcpcb.com/partdetail/C3015150; ComponentLink3Description: LCSC Part URL; ComponentLink3URL: https://lcsc.com/product-detail/Multilayer-Ceramic-Capacitors-MLCC---SMD-SMT_HRE-HRE-CSA1206X7R103K500KT_C3015150.html
footprint CAP-1206 (1206 (3216M) Capacitor)
pins: 1, 2

## ECWU1332JX5
designator C?  Capacitance: 3.3nF  (hidden comment: *)
Capacitor, Ceramic (MLCC), 3.3nF, ±5%, 100V, PEN, ±5%, SMD 1206; Manufacturer: PANASONIC; Manufacturer Part Number: ECWU1332JX5; Package Size: 1206; JLCPCB Basic Part: No; JLCPCB Part Number: C242111; Supplier 1: LCSC; Category: Capacitors - MLCC; Supplier Part Number 1: C242111; Tolerance: ±5%; Voltage Rating: 100V; Temperature Coefficient: PEN; RoHS: Yes; ComponentLink1Description: Datasheet; ComponentLink1URL: https://wmsc.lcsc.com/wmsc/upload/file/pdf/v2/lcsc/1912111437_PANASONIC-ECWU1332JX5_C242111.pdf; ComponentLink2Description: JLCPCB Part URL; ComponentLink2URL: https://jlcpcb.com/partdetail/C242111; ComponentLink3Description: LCSC Part URL; ComponentLink3URL: https://lcsc.com/product-detail/Multilayer-Ceramic-Capacitors-MLCC---SMD-SMT_PANASONIC-PANASONIC-ECWU1332JX5_C242111.html
footprint CAP-1206 (1206 (3216M) Capacitor)
pins: 1, 2

## EMJ316BB7106KLHT
designator C?  Capacitance: 10uF  (hidden comment: *)
Capacitor, Ceramic (MLCC), 10uF, ±10%, 16V, X7R, ±10%, SMD 1206; Manufacturer: Taiyo Yuden; Manufacturer Part Number: EMJ316BB7106KLHT; Package Size: 1206; JLCPCB Basic Part: No; JLCPCB Part Number: C2170791; Supplier 1: LCSC; Category: Capacitors - MLCC; Supplier Part Number 1: C2170791; Tolerance: ±10%; Voltage Rating: 16V; Temperature Coefficient: X7R; RoHS: Yes; ComponentLink1Description: Datasheet; ComponentLink1URL: https://wmsc.lcsc.com/wmsc/upload/file/pdf/v2/lcsc/2211282030_Taiyo-Yuden-EMJ316BB7106KLHT_C2170791.pdf; ComponentLink2Description: JLCPCB Part URL; ComponentLink2URL: https://jlcpcb.com/partdetail/C2170791; ComponentLink3Description: LCSC Part URL; ComponentLink3URL: https://lcsc.com/product-detail/Multilayer-Ceramic-Capacitors-MLCC---SMD-SMT_Taiyo-Yuden-Taiyo-Yuden-EMJ316BB7106KLHT_C2170791.html
footprint CAP-1206 (1206 (3216M) Capacitor)
pins: 1, 2

## EMK316AB7106KL-T
designator C?  Capacitance: 10uF  (hidden comment: *)
Capacitor, Ceramic (MLCC), 10uF, ±10%, 16V, X7R, ±10%, SMD 1206; Manufacturer: Taiyo Yuden; Manufacturer Part Number: EMK316AB7106KL-T; Package Size: 1206; JLCPCB Basic Part: No; JLCPCB Part Number: C319199; Supplier 1: LCSC; Category: Capacitors - MLCC; Supplier Part Number 1: C319199; Tolerance: ±10%; Voltage Rating: 16V; Temperature Coefficient: X7R; RoHS: Yes; ComponentLink1Description: Datasheet; ComponentLink1URL: https://wmsc.lcsc.com/wmsc/upload/file/pdf/v2/lcsc/2304140030_Taiyo-Yuden-EMK316AB7106KL-T_C319199.pdf; ComponentLink2Description: JLCPCB Part URL; ComponentLink2URL: https://jlcpcb.com/partdetail/C319199; ComponentLink3Description: LCSC Part URL; ComponentLink3URL: https://lcsc.com/product-detail/Multilayer-Ceramic-Capacitors-MLCC---SMD-SMT_Taiyo-Yuden-Taiyo-Yuden-EMK316AB7106KL-T_C319199.html
footprint CAP-1206 (1206 (3216M) Capacitor)
pins: 1, 2

## EMK316AB7106KLHT
designator C?  Capacitance: 10uF  (hidden comment: *)
Capacitor, Ceramic (MLCC), 10uF, ±10%, 16V, X7R, ±10%, SMD 1206; Manufacturer: Taiyo Yuden; Manufacturer Part Number: EMK316AB7106KLHT; Package Size: 1206; JLCPCB Basic Part: No; JLCPCB Part Number: C385903; Supplier 1: LCSC; Category: Capacitors - MLCC; Supplier Part Number 1: C385903; Tolerance: ±10%; Voltage Rating: 16V; Temperature Coefficient: X7R; RoHS: Yes; ComponentLink1Description: Datasheet; ComponentLink1URL: https://wmsc.lcsc.com/wmsc/upload/file/pdf/v2/lcsc/2211282230_Taiyo-Yuden-EMK316AB7106KLHT_C385903.pdf; ComponentLink2Description: JLCPCB Part URL; ComponentLink2URL: https://jlcpcb.com/partdetail/C385903; ComponentLink3Description: LCSC Part URL; ComponentLink3URL: https://lcsc.com/product-detail/Multilayer-Ceramic-Capacitors-MLCC---SMD-SMT_Taiyo-Yuden-Taiyo-Yuden-EMK316AB7106KLHT_C385903.html
footprint CAP-1206 (1206 (3216M) Capacitor)
pins: 1, 2

## EMK316AB7475KLHT
designator C?  Capacitance: 4.7uF  (hidden comment: *)
Capacitor, Ceramic (MLCC), 4.7uF, ±10%, 16V, X7R, ±10%, SMD 1206; Manufacturer: Taiyo Yuden; Manufacturer Part Number: EMK316AB7475KLHT; Package Size: 1206; JLCPCB Basic Part: No; JLCPCB Part Number: C385904; Supplier 1: LCSC; Category: Capacitors - MLCC; Supplier Part Number 1: C385904; Tolerance: ±10%; Voltage Rating: 16V; Temperature Coefficient: X7R; RoHS: Yes; ComponentLink1Description: Datasheet; ComponentLink1URL: https://wmsc.lcsc.com/wmsc/upload/file/pdf/v2/lcsc/2211282230_Taiyo-Yuden-EMK316AB7475KLHT_C385904.pdf; ComponentLink2Description: JLCPCB Part URL; ComponentLink2URL: https://jlcpcb.com/partdetail/C385904; ComponentLink3Description: LCSC Part URL; ComponentLink3URL: https://lcsc.com/product-detail/Multilayer-Ceramic-Capacitors-MLCC---SMD-SMT_Taiyo-Yuden-Taiyo-Yuden-EMK316AB7475KLHT_C385904.html
footprint CAP-1206 (1206 (3216M) Capacitor)
pins: 1, 2

## EMK316ABJ226KL-T
designator C?  Capacitance: 22uF  (hidden comment: *)
Capacitor, Ceramic (MLCC), 22uF, ±10%, 16V, X5R, ±10%, SMD 1206; Manufacturer: Taiyo Yuden; Manufacturer Part Number: EMK316ABJ226KL-T; Package Size: 1206; JLCPCB Basic Part: No; JLCPCB Part Number: C319197; Supplier 1: LCSC; Category: Capacitors - MLCC; Supplier Part Number 1: C319197; Tolerance: ±10%; Voltage Rating: 16V; Temperature Coefficient: X5R; RoHS: Yes; ComponentLink1Description: Datasheet; ComponentLink1URL: https://wmsc.lcsc.com/wmsc/upload/file/pdf/v2/lcsc/2211282230_Taiyo-Yuden-EMK316ABJ226KL-T_C319197.pdf; ComponentLink2Description: JLCPCB Part URL; ComponentLink2URL: https://jlcpcb.com/partdetail/C319197; ComponentLink3Description: LCSC Part URL; ComponentLink3URL: https://lcsc.com/product-detail/Multilayer-Ceramic-Capacitors-MLCC---SMD-SMT_Taiyo-Yuden-Taiyo-Yuden-EMK316ABJ226KL-T_C319197.html
footprint CAP-1206 (1206 (3216M) Capacitor)
pins: 1, 2

## EMK316ABJ226ML-T
designator C?  Capacitance: 22uF  (hidden comment: *)
Capacitor, Ceramic (MLCC), 22uF, ±20%, 16V, X5R, ±20%, SMD 1206; Manufacturer: Taiyo Yuden; Manufacturer Part Number: EMK316ABJ226ML-T; Package Size: 1206; JLCPCB Basic Part: No; JLCPCB Part Number: C92764; Supplier 1: LCSC; Category: Capacitors - MLCC; Supplier Part Number 1: C92764; Tolerance: ±20%; Voltage Rating: 16V; Temperature Coefficient: X5R; RoHS: Yes; ComponentLink1Description: Datasheet; ComponentLink1URL: https://wmsc.lcsc.com/wmsc/upload/file/pdf/v2/lcsc/2211282300_Taiyo-Yuden-EMK316ABJ226ML-T_C92764.pdf; ComponentLink2Description: JLCPCB Part URL; ComponentLink2URL: https://jlcpcb.com/partdetail/C92764; ComponentLink3Description: LCSC Part URL; ComponentLink3URL: https://lcsc.com/product-detail/Multilayer-Ceramic-Capacitors-MLCC---SMD-SMT_Taiyo-Yuden-Taiyo-Yuden-EMK316ABJ226ML-T_C92764.html
footprint CAP-1206 (1206 (3216M) Capacitor)
pins: 1, 2

## EMK316B7106KL-T
designator C?  Capacitance: 10uF  (hidden comment: *)
Capacitor, Ceramic (MLCC), 10uF, ±10%, 16V, X7R, ±10%, SMD 1206; Manufacturer: Taiyo Yuden; Manufacturer Part Number: EMK316B7106KL-T; Package Size: 1206; JLCPCB Basic Part: No; JLCPCB Part Number: C92765; Supplier 1: LCSC; Category: Capacitors - MLCC; Supplier Part Number 1: C92765; Tolerance: ±10%; Voltage Rating: 16V; Temperature Coefficient: X7R; RoHS: Yes; ComponentLink1Description: Datasheet; ComponentLink1URL: https://wmsc.lcsc.com/wmsc/upload/file/pdf/v2/lcsc/1810311021_Taiyo-Yuden-EMK316B7106KL-T_C92765.pdf; ComponentLink2Description: JLCPCB Part URL; ComponentLink2URL: https://jlcpcb.com/partdetail/C92765; ComponentLink3Description: LCSC Part URL; ComponentLink3URL: https://lcsc.com/product-detail/Multilayer-Ceramic-Capacitors-MLCC---SMD-SMT_Taiyo-Yuden-Taiyo-Yuden-EMK316B7106KL-T_C92765.html
footprint CAP-1206 (1206 (3216M) Capacitor)
pins: 1, 2

## EMK316BB7226ML-T
designator C?  Capacitance: 22uF  (hidden comment: *)
Capacitor, Ceramic (MLCC), 22uF, ±20%, 16V, X7R, ±20%, SMD 1206; Manufacturer: Taiyo Yuden; Manufacturer Part Number: EMK316BB7226ML-T; Package Size: 1206; JLCPCB Basic Part: No; JLCPCB Part Number: C385906; Supplier 1: LCSC; Category: Capacitors - MLCC; Supplier Part Number 1: C385906; Tolerance: ±20%; Voltage Rating: 16V; Temperature Coefficient: X7R; RoHS: Yes; ComponentLink1Description: Datasheet; ComponentLink1URL: https://wmsc.lcsc.com/wmsc/upload/file/pdf/v2/lcsc/2312211606_Taiyo-Yuden-EMK316BB7226ML-T_C385906.pdf; ComponentLink2Description: JLCPCB Part URL; ComponentLink2URL: https://jlcpcb.com/partdetail/C385906; ComponentLink3Description: LCSC Part URL; ComponentLink3URL: https://lcsc.com/product-detail/Multilayer-Ceramic-Capacitors-MLCC---SMD-SMT_Taiyo-Yuden-Taiyo-Yuden-EMK316BB7226ML-T_C385906.html
footprint CAP-1206 (1206 (3216M) Capacitor)
pins: 1, 2

## EMK316BBJ226MLHT
designator C?  Capacitance: 22uF  (hidden comment: *)
Capacitor, Ceramic (MLCC), 22uF, ±20%, 16V, X5R, ±20%, SMD 1206; Manufacturer: Taiyo Yuden; Manufacturer Part Number: EMK316BBJ226MLHT; Package Size: 1206; JLCPCB Basic Part: No; JLCPCB Part Number: C650956; Supplier 1: LCSC; Category: Capacitors - MLCC; Supplier Part Number 1: C650956; Tolerance: ±20%; Voltage Rating: 16V; Temperature Coefficient: X5R; RoHS: Yes; ComponentLink1Description: Datasheet; ComponentLink1URL: https://wmsc.lcsc.com/wmsc/upload/file/pdf/v2/lcsc/2304140030_Taiyo-Yuden-EMK316BBJ226MLHT_C650956.pdf; ComponentLink2Description: JLCPCB Part URL; ComponentLink2URL: https://jlcpcb.com/partdetail/C650956; ComponentLink3Description: LCSC Part URL; ComponentLink3URL: https://lcsc.com/product-detail/Multilayer-Ceramic-Capacitors-MLCC---SMD-SMT_Taiyo-Yuden-Taiyo-Yuden-EMK316BBJ226MLHT_C650956.html
footprint CAP-1206 (1206 (3216M) Capacitor)
pins: 1, 2

## EMK316BBJ476ML-T
designator C?  Capacitance: 47uF  (hidden comment: *)
Capacitor, Ceramic (MLCC), 47uF, ±20%, 16V, X5R, ±20%, SMD 1206; Manufacturer: Taiyo Yuden; Manufacturer Part Number: EMK316BBJ476ML-T; Package Size: 1206; JLCPCB Basic Part: No; JLCPCB Part Number: C385907; Supplier 1: LCSC; Category: Capacitors - MLCC; Supplier Part Number 1: C385907; Tolerance: ±20%; Voltage Rating: 16V; Temperature Coefficient: X5R; RoHS: Yes; ComponentLink1Description: Datasheet; ComponentLink1URL: https://wmsc.lcsc.com/wmsc/upload/file/pdf/v2/lcsc/2304140030_Taiyo-Yuden-EMK316BBJ476ML-T_C385907.pdf; ComponentLink2Description: JLCPCB Part URL; ComponentLink2URL: https://jlcpcb.com/partdetail/C385907; ComponentLink3Description: LCSC Part URL; ComponentLink3URL: https://lcsc.com/product-detail/Multilayer-Ceramic-Capacitors-MLCC---SMD-SMT_Taiyo-Yuden-Taiyo-Yuden-EMK316BBJ476ML-T_C385907.html
footprint CAP-1206 (1206 (3216M) Capacitor)
pins: 1, 2

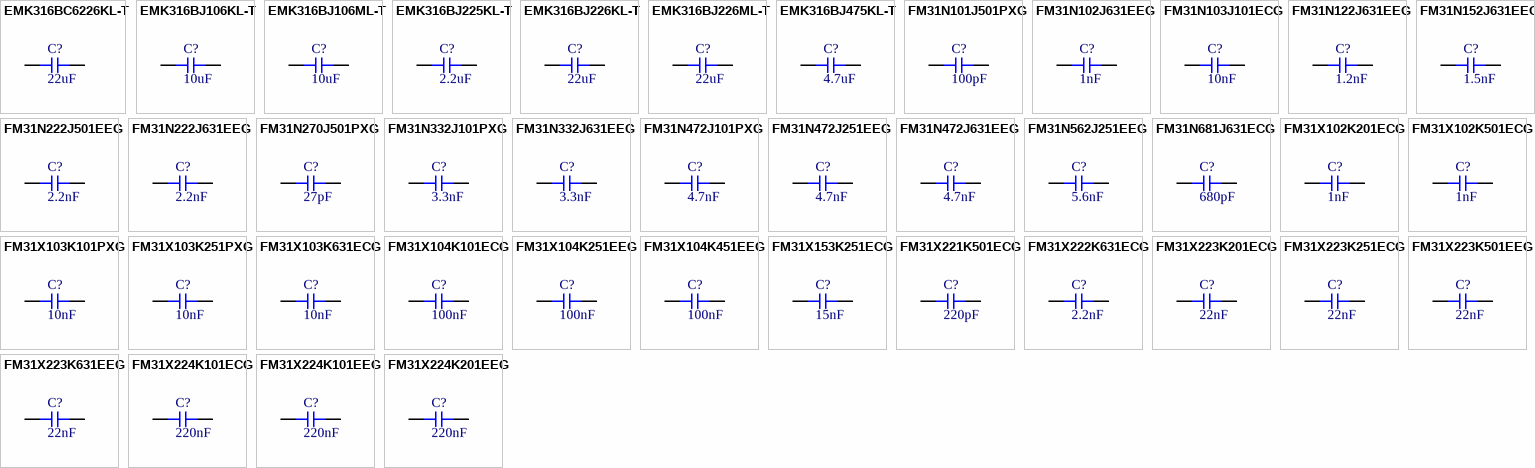
[diagram p40: symbols EMK316BC6226KL-T to FM31X224K201EEG]

## EMK316BC6226KL-T
designator C?  Capacitance: 22uF  (hidden comment: *)
Capacitor, Ceramic (MLCC), 22uF, 16V, SMD 1206; Manufacturer: Taiyo Yuden; Manufacturer Part Number: EMK316BC6226KL-T; Package Size: 1206; JLCPCB Basic Part: No; JLCPCB Part Number: C2938609; Supplier 1: LCSC; Category: Capacitors - MLCC; Supplier Part Number 1: C2938609; Voltage Rating: 16V; RoHS: Yes; ComponentLink1Description: Datasheet; ComponentLink1URL: https://wmsc.lcsc.com/wmsc/upload/file/pdf/v2/lcsc/2201121830_Taiyo-Yuden-EMK316BC6226KL-T_C2938609.pdf; ComponentLink2Description: JLCPCB Part URL; ComponentLink2URL: https://jlcpcb.com/partdetail/C2938609; ComponentLink3Description: LCSC Part URL; ComponentLink3URL: https://lcsc.com/product-detail/Multilayer-Ceramic-Capacitors-MLCC---SMD-SMT_Taiyo-Yuden-Taiyo-Yuden-EMK316BC6226KL-T_C2938609.html
footprint CAP-1206 (1206 (3216M) Capacitor)
pins: 1, 2

## EMK316BJ106KL-T
designator C?  Capacitance: 10uF  (hidden comment: *)
Capacitor, Ceramic (MLCC), 10uF, ±10%, 16V, X5R, ±10%, SMD 1206; Manufacturer: Taiyo Yuden; Manufacturer Part Number: EMK316BJ106KL-T; Package Size: 1206; JLCPCB Basic Part: No; JLCPCB Part Number: C87160; Supplier 1: LCSC; Category: Capacitors - MLCC; Supplier Part Number 1: C87160; Tolerance: ±10%; Voltage Rating: 16V; Temperature Coefficient: X5R; RoHS: Yes; ComponentLink1Description: Datasheet; ComponentLink1URL: https://wmsc.lcsc.com/wmsc/upload/file/pdf/v2/lcsc/2211282300_Taiyo-Yuden-EMK316BJ106KL-T_C87160.pdf; ComponentLink2Description: JLCPCB Part URL; ComponentLink2URL: https://jlcpcb.com/partdetail/C87160; ComponentLink3Description: LCSC Part URL; ComponentLink3URL: https://lcsc.com/product-detail/Multilayer-Ceramic-Capacitors-MLCC---SMD-SMT_Taiyo-Yuden-Taiyo-Yuden-EMK316BJ106KL-T_C87160.html
footprint CAP-1206 (1206 (3216M) Capacitor)
pins: 1, 2
